# Altium integrated library BPQ.IntLib: 27 symbols
Pins are listed as number, name and electrical type; pins without a type are passive.

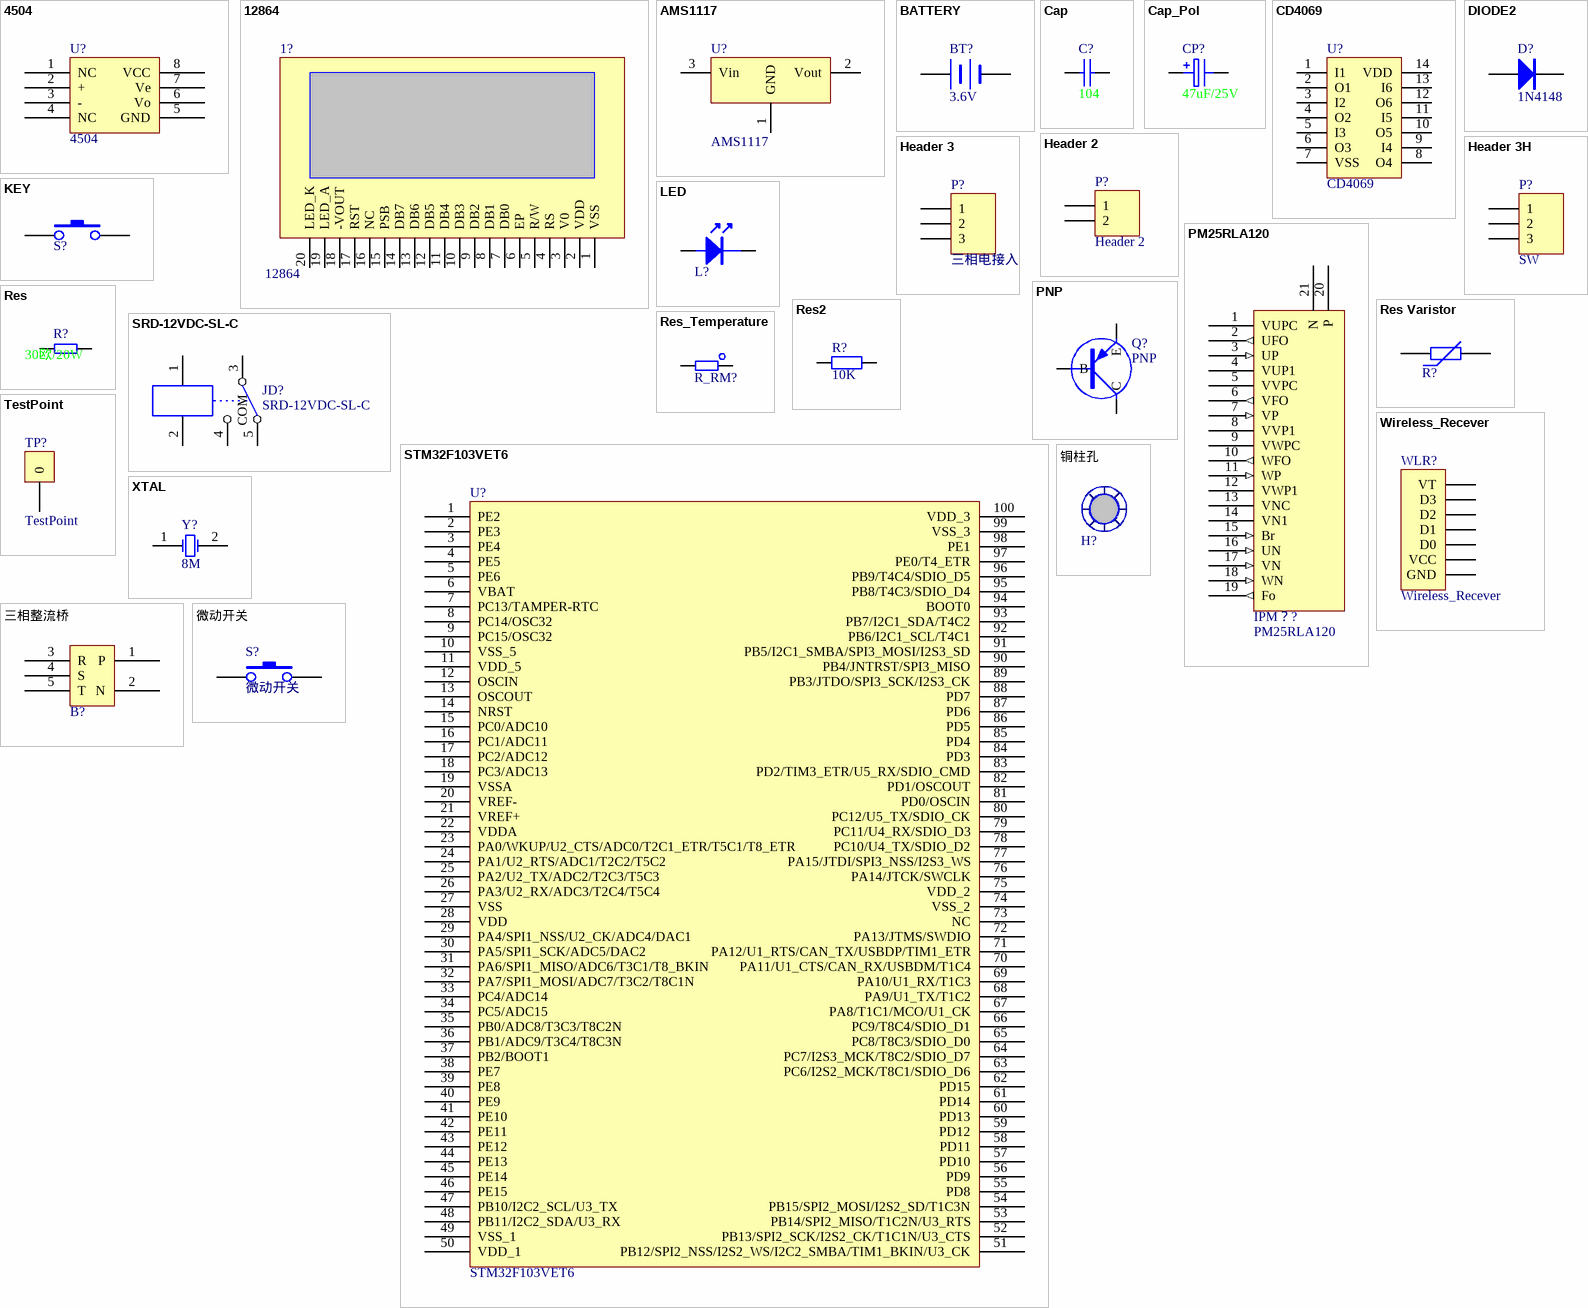
[diagram p0: symbols 4504 to 铜柱孔]

## 4504
designator U?
footprint DIP-8 (DIP; 8 Leads; Row Spacing 7.62 mm; Pitch 2.54 mm)
pins: 1 NC, 2 +, 3 -, 4 NC, 5 GND, 6 Vo, 7 Ve, 8 VCC

## 12864
designator 1?
footprint YX12864B
pins: 1 VSS, 2 VDD, 3 V0, 4 RS, 5 R/W, 6 EP, 7 DB0, 8 DB1, 9 DB2, 10 DB3, 11 DB4, 12 DB5, 13 DB6, 14 DB7, 15 PSB, 16 NC, 17 RST, 18 -VOUT, 19 LED_A, 20 LED_K

## AMS1117
designator U?
三端稳压器件
footprint SOT223
pins: 1 GND, 2 Vout, 3 Vin

## BATTERY
designator BT?, comment 3.6V
3.6V纽扣电池
footprint BAT3V
footprint CR1220
pins: 1 +, 2 -
2 alternate drawings of the same symbol

## Cap
designator C?, comment 104
非极性电容
footprint 0805C
pins: 1, 2

## Cap_Pol
designator CP?, comment 47uF/25V
极性电容
footprint CAP_6.3X5.4 (47u/25V)
footprint SMD-CT-3216 (贴片胆电容封装，长3.2mm,宽1.6mm)
footprint SMD-EC-F8 (贴片电解电容封装)
pins: 1, 2

## CD4069
designator U?
footprint CD4069
footprint SO-14
pins: 1 I1, 2 O1, 3 I2, 4 O2, 5 I3, 6 O3, 7 VSS, 8 O4, 9 I4, 10 O5, 11 I5, 12 O6, 13 I6, 14 VDD

## DIODE2
designator D?, comment 1N4148
footprint 1206_D
footprint Diode_1206
pins: 1, 2
2 alternate drawings of the same symbol

## Header 2
designator P?
Header, 2-Pin; LatestRevisionDate: 17-Jul-2002; LatestRevisionNote: Re-released for DXP Platform.; Publisher: Altium Limited
footprint HDR1X2 (Connector; Header; 2 Position)
signal-integrity model Connector
pins: 1, 2

## Header 3
designator P?, comment 三相电接入口
Header, 3-Pin; LatestRevisionDate: 17-Jul-2002; LatestRevisionNote: Re-released for DXP Platform.; Publisher: Altium Limited
footprint 30A/300V
pins: 1, 2, 3

## Header 3H
designator P?, comment SW
Header, 3-Pin, Right Angle; LatestRevisionDate: 17-Jul-2002; LatestRevisionNote: Re-released for DXP Platform.; Publisher: Altium Limited
footprint HDR1X3H (Connector; Header; 3 Position; Right Angle)
signal-integrity model Connector
pins: 1, 2, 3

## KEY
designator S?  (value not drawn)
footprint SW_PB - 6.5x4.5
3D model 4pin_TS-1143-WP (PCB3D Model)
pins: 1, 2

## LED
designator L?  (value not drawn)
发光二极管
footprint LED_1206
footprint LED_DIP (引脚间距95mil(2.4mm)，适合草帽led)
footprint LED_LIGHT (照明用1W大灯珠的封装)
pins: 1, 2

## PM25RLA120
designator IPM？?
三菱IPM模块25A 1200V
footprint PM25RLA120 (三菱IPM模块)
pins: 1 VUPC (power), 2 UFO (out), 3 UP (in), 4 VUP1 (power), 5 VVPC (power), 6 VFO (out), 7 VP (in), 8 VVP1 (power), 9 VWPC (power), 10 WFO (out), 11 WP (in), 12 VWP1, 13 VNC, 14 VN1, 15 Br (in), 16 UN (in), 17 VN (in), 18 WN (in), 19 Fo (out), 20 P, 21 N

## PNP
designator Q?
PNP Transistor
footprint SOT23
pins: B, C, E

## Res
designator R?, comment 30欧/20W
电阻
footprint R_30R/20W (水泥电阻)
pins: 1, 2

## Res2
designator R?, comment 10K
Resistor; Published: 8-Jun-2000; LatestRevisionDate: 17-Jul-2002; LatestRevisionNote: Re-released for DXP Platform.; PackageReference: AXIAL-0.4; Publisher: Altium Limited; Value: 10K
footprint AXIAL-0.4 (Axial Device, Thru-Hole; 2 Leads; 0.4 in Pin Spacing)
simulation model RESISTOR (Resistor)
signal-integrity model Res
footprint 0805R
pins: 1, 2

## Res Varistor
designator R?  (value not drawn)
Varistor (Voltage-Sensitive Resistor); Published: 24-Mar-1999; LatestRevisionDate: 29-May-2009; LatestRevisionNote: IPC-7351 Footprint Added.; PackageVersion: Mar-2003; PackageReference: 6-0805; Publisher: Altium Limited; PackageDescription: Chip Resistor 0805 Case Size; Code_IPC: RESC2012
footprint R_VDR (压敏电阻封装，管脚距离8mm)
pins: 1, 2

## Res_Temperature
designator R_RM?, comment 热敏电阻  (value not drawn)
footprint R_RM
pins: 1, 2

## SRD-12VDC-SL-C
designator JD?
松乐 10A    12V继电器
footprint SRD-12VDC-SL-C
pins: 1, 2, 3 COM, 4, 5

## STM32F103VET6
designator U?
footprint LQFP100
pins: 1 PE2, 2 PE3, 3 PE4, 4 PE5, 5 PE6, 6 VBAT, 7 PC13/TAMPER-RTC, 8 PC14/OSC32, 9 PC15/OSC32, 10 VSS_5, 11 VDD_5, 12 OSCIN, 13 OSCOUT, 14 NRST, 15 PC0/ADC10, 16 PC1/ADC11, 17 PC2/ADC12, 18 PC3/ADC13, 19 VSSA, 20 VREF-, 21 VREF+, 22 VDDA, 23 PA0/WKUP/U2_CTS/ADC0/T2C1_ETR/T5C1/T8_ETR, 24 PA1/U2_RTS/ADC1/T2C2/T5C2, 25 PA2/U2_TX/ADC2/T2C3/T5C3, 26 PA3/U2_RX/ADC3/T2C4/T5C4, 27 VSS, 28 VDD, 29 PA4/SPI1_NSS/U2_CK/ADC4/DAC1, 30 PA5/SPI1_SCK/ADC5/DAC2, 31 PA6/SPI1_MISO/ADC6/T3C1/T8_BKIN, 32 PA7/SPI1_MOSI/ADC7/T3C2/T8C1N, 33 PC4/ADC14, 34 PC5/ADC15, 35 PB0/ADC8/T3C3/T8C2N, 36 PB1/ADC9/T3C4/T8C3N, 37 PB2/BOOT1, 38 PE7, 39 PE8, 40 PE9, 41 PE10, 42 PE11, 43 PE12, 44 PE13, 45 PE14, 46 PE15, 47 PB10/I2C2_SCL/U3_TX, 48 PB11/I2C2_SDA/U3_RX, 49 VSS_1, 50 VDD_1, 51 PB12/SPI2_NSS/I2S2_WS/I2C2_SMBA/TIM1_BKIN/U3_CK, 52 PB13/SPI2_SCK/I2S2_CK/T1C1N/U3_CTS, 53 PB14/SPI2_MISO/T1C2N/U3_RTS, 54 PB15/SPI2_MOSI/I2S2_SD/T1C3N, 55 PD8, 56 PD9, 57 PD10, 58 PD11, 59 PD12, 60 PD13, 61 PD14, 62 PD15, 63 PC6/I2S2_MCK/T8C1/SDIO_D6, 64 PC7/I2S3_MCK/T8C2/SDIO_D7, 65 PC8/T8C3/SDIO_D0, 66 PC9/T8C4/SDIO_D1, 67 PA8/T1C1/MCO/U1_CK, 68 PA9/U1_TX/T1C2, 69 PA10/U1_RX/T1C3, 70 PA11/U1_CTS/CAN_RX/USBDM/T1C4, 71 PA12/U1_RTS/CAN_TX/USBDP/TIM1_ETR, 72 PA13/JTMS/SWDIO, 73 NC, 74 VSS_2, 75 VDD_2, 76 PA14/JTCK/SWCLK, 77 PA15/JTDI/SPI3_NSS/I2S3_WS, 78 PC10/U4_TX/SDIO_D2, 79 PC11/U4_RX/SDIO_D3, 80 PC12/U5_TX/SDIO_CK, 81 PD0/OSCIN, 82 PD1/OSCOUT, 83 PD2/TIM3_ETR/U5_RX/SDIO_CMD, 84 PD3, 85 PD4, 86 PD5, 87 PD6, 88 PD7, 89 PB3/JTDO/SPI3_SCK/I2S3_CK, 90 PB4/JNTRST/SPI3_MISO, 91 PB5/I2C1_SMBA/SPI3_MOSI/I2S3_SD, 92 PB6/I2C1_SCL/T4C1, 93 PB7/I2C1_SDA/T4C2, 94 BOOT0, 95 PB8/T4C3/SDIO_D4, 96 PB9/T4C4/SDIO_D5, 97 PE0/T4_ETR, 98 PE1, 99 VSS_3, 100 VDD_3

## TestPoint
designator TP?
footprint TEST-POINT
pins: 0

## Wireless_Recever
designator WLR?
Connector
footprint Wireless_Recever (433无线遥控接收端)
pins: 1 GND, 2 VCC, 3 D0, 4 D1, 5 D2, 6 D3, 7 VT

## XTAL
designator Y?, comment 8M
Crystal Oscillator; Published: 8-Jun-2000; LatestRevisionDate: 17-Jul-2002; LatestRevisionNote: Re-released for DXP Platform.; PackageReference: R38; Publisher: Altium Limited; PackageDescription: Crystal, Thru-Hole; 2 Leads; Body 3.1 x 8.2 mm (Dia.xH)
footprint XTAL2
simulation model XTAL (Spice Subcircuit)
pins: 1 OSC1, 2 OSC2

## 三相整流桥
designator B?, comment 3BRIDGE  (value not drawn)
footprint 三相整流桥 (6RI130G-160   30A/1600V)
pins: 1 P, 2 N, 3 R, 4 S, 5 T

## 微动开关
designator S?
footprint SW_PB - 6.5x4.5
pins: 1, 2

## 铜柱孔
designator H?  (value not drawn)
footprint HOLE (铜柱孔)
pins: 0, 0